# Altium footprint library E17-04-PCB1.PcbLib: 39 footprints (part 3 of 3)
Each footprint in its own frame and in the unit in brackets; x right, y up, seen from the top. Pads: shape width x height; smd on the part's side, far side on the other; paste and mask are expansions set on the pad; w line width, h text height; cw(c..) or ccw(c..) is an arc to the next point about the centre after c.
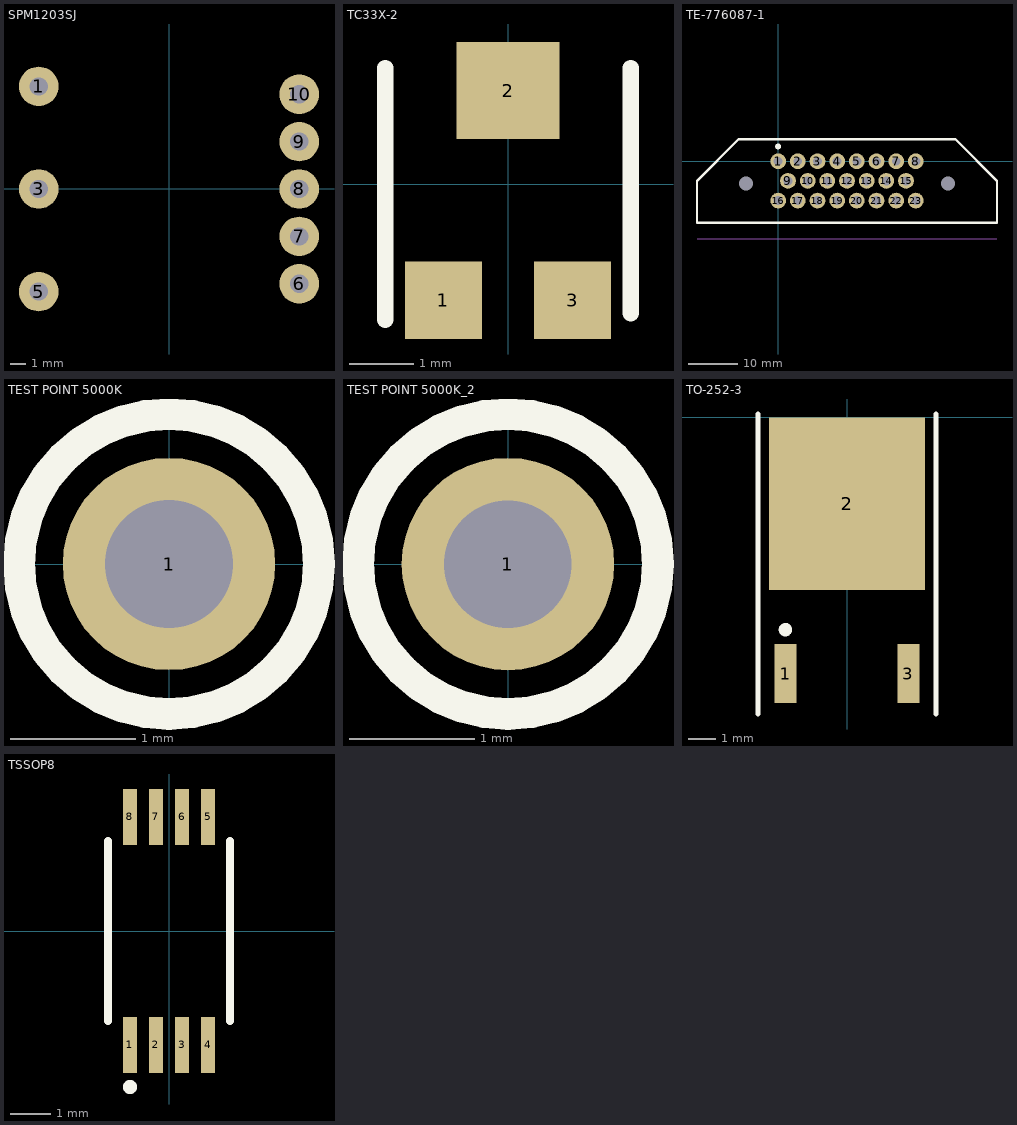
[diagram p2: the footprints below, top view; thin cyan lines are the x and y axes]

## SPM1203SJ [mm]
pads (8):
  round 2.5 hole 1.15: 1(-8.25,6.5) 3(-8.25,0) 5(-8.25,-6.5) 6(8.25,-6) 7(8.25,-3) 8(8.25,0) 9(8.25,3) 10(8.25,6)
3D body "SPM1203SJ.STEP": height 13.5, standoff -3, extent -14.054,-9 13.546,9

## TC33X-2 [mm] "Trimmer Pot"
pads (3):
  rect 1.2x1.2 smd: 1(-1,-1.8) 3(1,-1.8)
  rect 1.6x1.5 smd: 2(0,1.45)
Top Overlay:
  lines w0.254: -1.9,-2.1 -1.9,1.8 ; 1.9,-2 1.9,1.8
3D body "TC-33X-1.stp": height 1.13, standoff -0.03, extent -1.822,-2.058 1.778,1.804

## TE-776087-1 [mm] "CONN HDR RTANG 23POS W/GASKT TIN"
height 29.1
pads (25):
  round 0 hole 2.85 unplated: 0(-6.5,-4.5) 0(34.5,-4.5)
  round 3.2 hole 1.8: 1(0,0) 2(4,0) 3(8,0) 4(12,0) 5(16,0) 6(20,0) 7(24,0) 8(28,0) 9(2,-4) 10(6,-4) 11(10,-4) 12(14,-4) 13(18,-4) 14(22,-4) 15(26,-4) 16(0,-8) 17(4,-8) 18(8,-8) 19(12,-8) 20(16,-8) 21(20,-8) 22(24,-8) 23(28,-8)
Top Overlay:
  circle w0.6: c0,3 r0.3
  lines w0.5: -16.5,-12.5 -16.5,-4 -8,4.5 36,4.5 44.5,-4 44.5,-12.5 -16.5,-12.5
Mechanical 1:
  lines w0.254: -16.4,-15.8 44.4,-15.8
3D body "776087-1-l-3d-ASM.STEP": height 27.77, standoff -4.33, extent -16.4,-35.8 44.4,2

## TEST POINT 5000K [mm] "Test Point, 5000 Keystone Series, 0.040\" Hole"
height 4.6
pads (1):
  round 1.7 hole 1.02 mask+0.1: 1(0,0)
Top Overlay:
  circle w0.254: c0,0 r1.2

## TEST POINT 5000K_2 [mm]
pads (1):
  round 1.7 hole 1.02 mask+0.1: 1(0,0)
Top Overlay:
  circle w0.254: c0,0 r1.2

## TO-252-3 [mm] "D-PAK/TO-252-3; 3 Leads"
height 2.4
pads (3):
  rect 0.8x2.2 smd: 1(-2.28,-9.5) 3(2.28,-9.5)
  rect 5.8x6.4 smd: 2(0,-3.2)
Top Overlay:
  circle w0.25: c-2.284,-7.874 r0.125
  lines w0.2: -3.3,-11 -3.3,0.125 ; 3.3,-11 3.3,0.125

## TSSOP8 [mm] "TSSOP8"
pads (8):
  rect 0.35x1.4 smd: 1(-0.975,-2.85) 2(-0.325,-2.85) 3(0.325,-2.85) 4(0.975,-2.85) 5(0.975,2.85) 6(0.325,2.85) 7(-0.325,2.85) 8(-0.975,2.85)
Top Overlay:
  circle w0.254: c-0.975,-3.9 r0.05
  lines w0.203: -1.525,-2.25 -1.525,2.25 ; 1.525,-2.25 1.525,2.25
3D body "SW3dPS-JEDEC MO-153 (TSSOP8).STEP": height 1.17, standoff -0.03, extent -1.5,-3.186 1.5,3.27